# Altium footprint library L3.PcbLib: 47 footprints (part 2 of 3)
Each footprint in its own frame and in the unit in brackets; x right, y up, seen from the top. Pads: shape width x height; smd on the part's side, far side on the other; paste and mask are expansions set on the pad; w line width, h text height; cw(c..) or ccw(c..) is an arc to the next point about the centre after c.
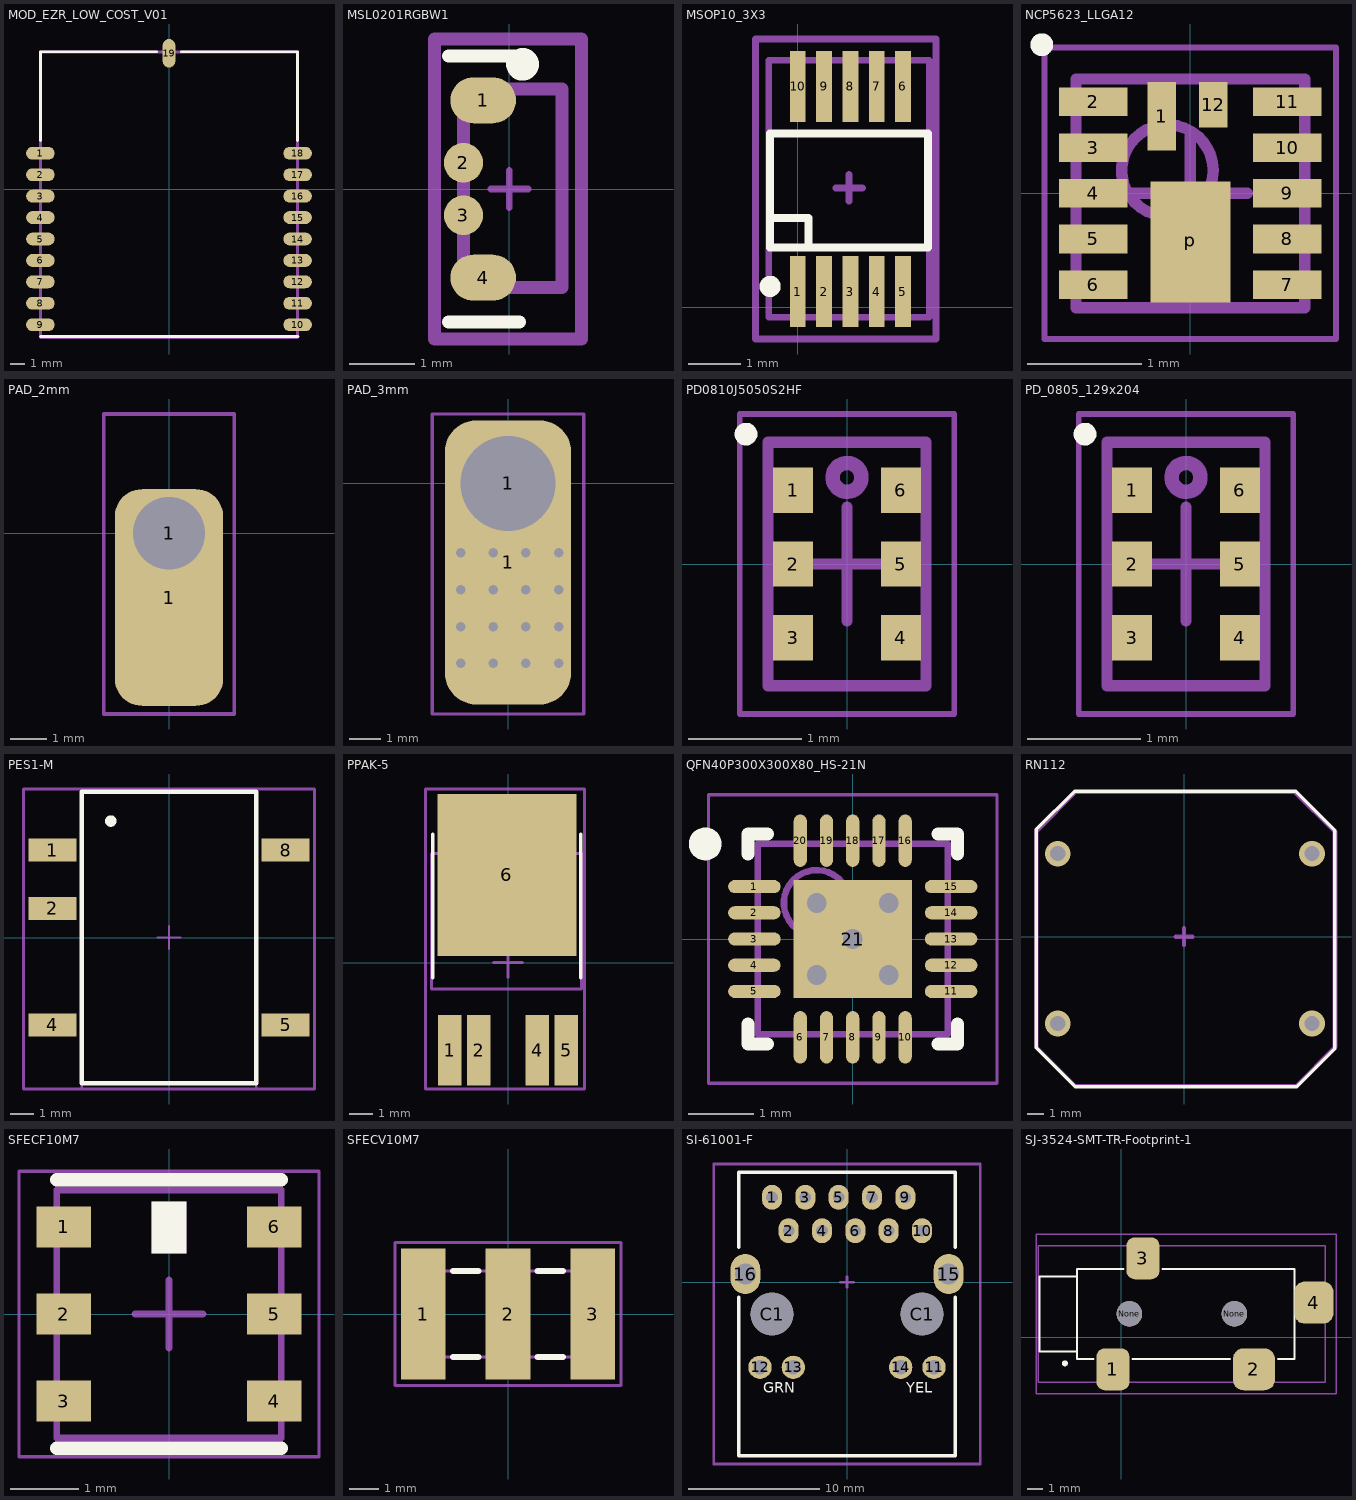
[diagram p1: the footprints below, top view; thin cyan lines are the x and y axes]

## MOD_EZR_LOW_COST_V01 [mm]
pads (19):
  oval 2x0.9 smd: 1(-9,2.5) 2(-9,1) 3(-9,-0.5) 4(-9,-2) 5(-9,-3.5) 6(-9,-5) 7(-9,-6.5) 8(-9,-8) 9(-9,-9.5) 10(9,-9.5) 11(9,-8) 12(9,-6.5) 13(9,-5) 14(9,-3.5) 15(9,-2) 16(9,-0.5) 17(9,1) 18(9,2.5)
  oval 0.9x2 smd: 19(0,9.5)
Top Overlay:
  lines w0.2: -9,-10.327 9.034,-10.327 ; -9,3.389 -9,9.612 -0.872,9.612 ; 0.872,9.612 9,9.612 9,3.389
Mechanical 1:
  lines w0.2: -9,-10.4 9,-10.4 9,9.6 -9,9.6 -9,-10.4
Mechanical 17:
  text "'.Designator'" at -6.096,-0.127 h1.52
3D body "Low_cost_module_PCB.step": height 2.96, standoff 0, extent -9,-10.4 9,9.6

## MSL0201RGBW1 [mm]
pads (4):
  oval 1x0.7 smd paste+0 mask+0: 1(-0.4,1.35) 4(-0.4,-1.35)
  round 0.6 smd paste+0 mask+0: 2(-0.7,0.4) 3(-0.7,-0.4)
Top Overlay:
  circle w0.25: c0.2,1.9 r0.125
  lines w0.2: -0.925,-2.025 0.15,-2.025 ; -0.925,2.025 0.15,2.025
Mechanical 2:
  lines w0.2: -0.7,-1.5 0.8,-1.5 0.801,1.524 -0.7,1.524 -0.7,-1.5
Mechanical 4:
  lines w0.1: -0.285,0 0.285,0 ; 0,-0.285 0,0.285
  lines w0.2: -1.143,-2.286 1.1,-2.286 1.1,2.286 -1.143,2.286 -1.143,-2.286
3D body "3dmodel.step": height 0.95, standoff -0.05, extent -0.703,-1.5 0.8,1.5

## MSOP10_3X3 [mm]
pads (10):
  rect 0.3x1.35 smd: 1(0,0.3) 2(0.5,0.3) 3(1,0.3) 4(1.5,0.3) 5(2,0.3) 6(2,4.2) 7(1.5,4.2) 8(1,4.2) 9(0.5,4.2) 10(0,4.2)
Top Overlay:
  circle w0.2: c-0.525,0.4 r0.1
  lines w0.152: -0.525,1.7 0.2,1.7 0.2,1.143 ; -0.525,1.143 2.475,1.143 2.475,3.302 -0.525,3.302 -0.525,1.143
Mechanical 1:
  lines w0.127: 0.721,2.27 1.229,2.27 ; 0.975,2.016 0.975,2.524 ; -0.803,-0.6 -0.803,5.1 2.626,5.1 2.626,-0.6 -0.803,-0.6
Mechanical 5:
  lines w0.127: -0.549,-0.185 -0.549,4.699 2.499,4.699 2.499,-0.185 -0.549,-0.185
3D body "User Library-msop-10.step": height 1.14, standoff -0.01, extent -0.499,-0.185 2.501,4.715

## NCP5623_LLGA12 [mm]
height 0.6
pads (13):
  rect 0.25x0.6 smd: 1(-0.25,0.675)
  rect 0.6x0.25 smd: 2(-0.85,0.8) 3(-0.85,0.4) 4(-0.85,0) 5(-0.85,-0.4) 6(-0.85,-0.8) 7(0.85,-0.8) 8(0.85,-0.4) 9(0.85,0) 10(0.85,0.4) 11(0.85,0.8)
  rect 0.25x0.4 smd: 12(0.2,0.775)
  rect 0.7x1.06 smd: p(0,-0.425)
Top Overlay:
  circle w0.1: c-1.3,1.3 r0.05
Mechanical 13:
  circle w0.1: c-0.2,0.2 r0.4
  lines w0.1: -1,-1 1,-1 1,1 -1,1 -1,-1
Mechanical 15:
  lines w0.05: -1.275,-1.275 1.275,-1.275 1.275,1.275 -1.275,1.275 -1.275,-1.275
  lines w0.1: -0.5,0 0.5,0 ; 0,-0.5 0,0.5
3D body "User Library-NCP5623C.step": height 0.45, standoff -0.05, extent -1,-1 1,1

## PAD_2mm [mm]
pads (2):
  rrect50% 3x6 smd: 1(0,-1.778)
  rrect50% 1.4x1.4 hole 2: 1(0,0)
Mechanical 1:
  lines w0.1: -1.8,-5 1.8,-5 1.8,3.3 -1.8,3.3 -1.8,-5

## PAD_3mm [mm]
pads (2):
  rrect50% 4x9 smd: 1(0,-2.5)
  rrect50% 3.5x3.5 hole 3: 1(0,0)
via 0.567,-2.2 diameter 0.6 hole 0.3
via 0.567,-3.367 diameter 0.6 hole 0.3
via 0.567,-4.533 diameter 0.6 hole 0.3
via 0.567,-5.7 diameter 0.6 hole 0.3
via -0.467,-2.2 diameter 0.6 hole 0.3
via -0.467,-3.367 diameter 0.6 hole 0.3
via -0.467,-4.533 diameter 0.6 hole 0.3
via -0.467,-5.7 diameter 0.6 hole 0.3
via -1.5,-2.2 diameter 0.6 hole 0.3
via 1.6,-2.2 diameter 0.6 hole 0.3
via 1.6,-3.367 diameter 0.6 hole 0.3
via -1.5,-3.367 diameter 0.6 hole 0.3
via 1.6,-4.533 diameter 0.6 hole 0.3
via -1.5,-4.533 diameter 0.6 hole 0.3
via 1.6,-5.7 diameter 0.6 hole 0.3
via -1.5,-5.7 diameter 0.6 hole 0.3
Mechanical 1:
  lines w0.1: -2.4,-7.3 2.4,-7.3 2.4,2.2 -2.4,2.2 -2.4,-7.3

## PD0810J5050S2HF [mm] "6-Leads, Body 1,29x2,04mm, Pitch 0,65mm, IPC Medium Density"
height 0.55
pads (6):
  rect 0.35x0.4 smd: 1(-0.475,0.65) 2(-0.475,0) 3(-0.475,-0.65) 4(0.475,-0.65) 5(0.475,0) 6(0.475,0.65)
Top Overlay:
  circle w0.1: c-0.889,1.143 r0.05
Mechanical 13:
  circle w0.127: c0,0.762 r0.127
  lines w0.1: -0.695,-1.07 0.695,-1.07 0.695,1.07 -0.695,1.07 -0.695,-1.07
Mechanical 15:
  lines w0.05: -0.945,-1.32 0.945,-1.32 0.945,1.32 -0.945,1.32 -0.945,-1.32
  lines w0.1: -0.5,0 0.5,0 ; 0,-0.5 0,0.5
Mechanical 17:
  text "'.Designator'" at -0.127,0.508 h0.38
Mechanical 19:
  text "'.Comment'" at -0.127,0.508 h0.38
3D body "User Library-B0322J5050AHF.step": height 0.7, standoff -0.01, extent -0.645,-1.02 0.645,1.02

## PD_0805_129x204 [mm] "6-Leads, Body 1,29x2,04mm, Pitch 0,65mm, IPC Medium Density"
height 0.55
pads (6):
  rect 0.35x0.4 smd: 1(-0.475,0.65) 2(-0.475,0) 3(-0.475,-0.65) 4(0.475,-0.65) 5(0.475,0) 6(0.475,0.65)
Top Overlay:
  circle w0.1: c-0.889,1.143 r0.05
Mechanical 13:
  circle w0.127: c0,0.762 r0.127
  lines w0.1: -0.695,-1.07 0.695,-1.07 0.695,1.07 -0.695,1.07 -0.695,-1.07
Mechanical 15:
  lines w0.05: -0.945,-1.32 0.945,-1.32 0.945,1.32 -0.945,1.32 -0.945,-1.32
  lines w0.1: -0.5,0 0.5,0 ; 0,-0.5 0,0.5
Mechanical 17:
  text "'.Designator'" at -0.127,0.508 h0.38
Mechanical 19:
  text "'.Comment'" at -0.127,0.508 h0.38
3D body "User Library-B0322J5050AHF.step": height 0.7, standoff -0.01, extent -0.645,-1.02 0.645,1.02

## PES1-M [mm]
pads (5):
  rect 2.1x1 smd: 1(-5.08,3.81) 2(-5.08,1.27) 4(-5.08,-3.81) 5(5.08,-3.81) 8(5.08,3.81)
Top Overlay:
  circle w0.25: c-2.54,5.08 r0.125
  lines w0.2: -3.81,-6.35 -3.81,6.35 3.81,6.35 3.81,-6.35 -3.81,-6.35
Mechanical 13:
  lines w0.1: -3.81,-6.604 -3.81,6.477 3.81,6.477 3.81,-6.604 -3.81,-6.604
Mechanical 15:
  lines w0.1: -0.5,0 0.5,0 ; 0,-0.5 0,0.5
  lines w0.127: -6.35,-6.604 6.35,-6.604 6.35,6.477 -6.35,6.477 -6.35,-6.604
Mechanical 17:
  text "'.Designator'" at -3.81,0 h0.64
Mechanical 19:
  text "'.Comment'" at -2.54,0 h0.64
3D body "CUI_PES1-S5-S9-M.step": height 7.25, standoff 0, extent -5.622,-6.35 5.622,6.35

## PPAK-5 [mil]
pads (5):
  rect 40x120 smd: 1(-99,-149.02) 2(-49.5,-149.02) 4(49.5,-149.02) 5(99,-149.02)
  rect 236.22x275.59 smd: 6(-2.02,149.02)
Top Overlay:
  lines w6: -128,-25.98 -128,218.12 ; 123.97,-25.98 123.97,218.12
Mechanical 13:
  lines w5: -130,-45 -130,185 125,185 125,-45 -130,-45
Mechanical 15:
  lines w5: -25,0 25,0 ; 0,-25 0,25 ; -140,-215 -140,295 -135,295 130,295 130,-215 -140,-215
Mechanical 17:
  text "'.Designator'" at -140,-15 h25
3D body "User Library-PPAK.step": height 90.55, standoff 0, extent -124.97,-168.97 127,212.92

## QFN40P300X300X80_HS-21N [mm] "QFN, 20-Leads, Body 3,00x3,00mm, Pitch 0,40mm, Thermal Pad 1,80x1,80mm, IPC Medium Density"
height 0.8
pads (21):
  oval 0.8x0.2 smd mask+0.05: 1(-1.5,0.8) 2(-1.5,0.4) 3(-1.5,0) 4(-1.5,-0.4) 5(-1.5,-0.8) 11(1.5,-0.8) 12(1.5,-0.4) 13(1.5,0) 14(1.5,0.4) 15(1.5,0.8)
  oval 0.2x0.8 smd mask+0.05: 6(-0.8,-1.5) 7(-0.4,-1.5) 8(0,-1.5) 9(0.4,-1.5) 10(0.8,-1.5) 16(0.8,1.5) 17(0.4,1.5) 18(0,1.5) 19(-0.4,1.5) 20(-0.8,1.5)
  rect 1.8x1.8 smd paste-3 mask+0.05: 21(0,0)
via -0.55,0.55 diameter 0.6 hole 0.3
via 0.55,0.55 diameter 0.6 hole 0.3
via -0.55,-0.55 diameter 0.6 hole 0.3
via 0.55,-0.55 diameter 0.6 hole 0.3
via 0,0 diameter 0.6 hole 0.3
Top Overlay:
  circle w0.25: c-2.25,1.45 r0.125
  lines w0.2: -1.6,-1.3 -1.6,-1.6 -1.3,-1.6 ; -1.6,1.3 -1.6,1.6 -1.3,1.6 ; 1.3,-1.6 1.6,-1.6 1.6,-1.3 ; 1.3,1.6 1.6,1.6 1.6,1.3
Top Paste:
  region: 0.15,-0.15 0.88,-0.15 0.88,-0.88 0.15,-0.88
  region: -0.88,-0.15 -0.15,-0.15 -0.15,-0.88 -0.88,-0.88
  region: -0.88,0.88 -0.15,0.88 -0.15,0.15 -0.88,0.15
  region: 0.15,0.88 0.88,0.88 0.88,0.15 0.15,0.15
Mechanical 13:
  circle w0.1: c-0.55,0.55 r0.5
  lines w0.1: -1.45,-1.45 -1.45,1.45 1.45,1.45 1.45,-1.45 -1.45,-1.45
Mechanical 15:
  lines w0.05: -2.2,-2.2 -2.2,2.2 2.2,2.2 2.2,-2.2 -2.2,-2.2
  lines w0.1: -0.5,0 0.5,0 ; 0,-0.5 0,0.5
3D body "QFN40P300X300X80_HS-21N.step": height 0.8, standoff 0, extent -1.5,-1.5 1.5,1.5

## RN112 [mm]
via 7.595,4.928 diameter 1.524 hole 0.9
via 7.595,-5.156 diameter 1.524 hole 0.9
via -7.493,-5.156 diameter 1.524 hole 0.9
via -7.493,4.928 diameter 1.524 hole 0.9
Top Overlay:
  lines w0.2: -8.763,6.325 -8.763,5.41 -8.763,-4.699 -8.763,-6.121 -8.763,-6.452 -8.763,-6.604 -6.452,-8.915 6.299,-8.915 6.68,-8.915 8.941,-6.655 8.941,-6.629 ; -8.763,6.35 -8.763,6.375 -6.502,8.636 -6.121,8.636 6.629,8.636 8.941,6.325 8.941,6.172 8.941,5.842 8.941,4.42 8.941,-5.69 8.941,-6.604
Mechanical 13:
  lines w0.2: -8.738,-6.553 -8.738,6.325 -6.477,8.585 6.553,8.585 8.915,6.223 8.915,-6.579 6.655,-8.839 -6.452,-8.839 -8.738,-6.553
Mechanical 15:
  lines w0.2: -8.788,6.299 -8.788,-6.528 -6.426,-8.89 6.629,-8.89 9.017,-6.502 9.017,6.198 6.655,8.56 -6.426,8.56 -8.687,6.299
  lines w0.254: -0.5,0 0.5,0 ; 0,-0.5 0,0.5
  text "1" at -6.096,-6.604 h1.52
  text "3" at -6.096,4.064 h1.52
  text "4" at 5.588,4.064 h1.52
  text "2" at 5.588,-6.096 h1.52
Mechanical 17:
  text "'.Designator'" at -3.556,0.508 h0.76
Mechanical 19:
  text "'.Comment'" at -3.048,-1.016 h0.76
3D body "36012.stp": height 12.5, standoff -4.1, extent -8.759,-8.865 8.941,8.636

## SFECF10M7 [mm] "6-Leads, Body 3,45x3,10mm, Pitch 1,28mm, IPC Medium Density"
height 1.4
pads (6):
  rect 0.8x0.6 smd: 1(-1.545,1.28) 2(-1.545,0) 3(-1.545,-1.28) 4(1.545,-1.28) 5(1.545,0) 6(1.545,1.28)
Top Overlay:
  rectangle: -0.254,0.889 0.254,1.651
  lines w0.2: -1.65,-1.975 1.65,-1.975 ; -1.65,1.975 1.65,1.975
Mechanical 13:
  rectangle: -0.254,0.889 0.254,1.651
  lines w0.1: -1.65,-1.825 1.65,-1.825 1.65,1.825 -1.65,1.825 -1.65,-1.825
Mechanical 15:
  lines w0.05: -2.205,-2.1 2.205,-2.1 2.205,2.1 -2.205,2.1 -2.205,-2.1
  lines w0.1: -0.5,0 0.5,0 ; 0,-0.5 0,0.5
Mechanical 17:
  text "'.Designator'" at -0.127,0.889 h0.38
Mechanical 19:
  text "'.Comment'" at -0.127,0.889 h0.38
3D body "User Library-SFECF10M7EA00S0-R0.step": height 1.32, standoff 0, extent -1.57,-1.725 1.57,1.725

## SFECV10M7 [mm]
pads (3):
  rect 1.5x4.4 smd: 1(-2.85,0) 2(0,0) 3(2.85,0)
Top Overlay:
  lines w0.2: -1.854,-1.448 -0.991,-1.448 ; -1.854,1.448 -0.991,1.448 ; 0.991,-1.45 1.854,-1.45 ; 0.991,1.448 1.854,1.448
Mechanical 13:
  lines w0.1: -3.429,-1.45 3.429,-1.45 3.429,1.45 -3.429,1.45 -3.429,-1.45
Mechanical 15:
  lines w0.1: -0.5,0 0.5,0 ; 0,-0.5 0,0.5 ; -3.81,-2.413 3.81,-2.413 3.81,2.413 -3.81,2.413 -3.81,-2.413
Mechanical 17:
  text "'.Designator'" at -3.048,-0.127 h0.61
Mechanical 19:
  text "'.Comment'" at -3.048,-0.127 h0.61
3D body "User Library-SFECV.STEP": height 1.53, standoff 0.01, extent -3.5,-1.524 3.5,1.496

## SI-61001-F [mm]
pads (18):
  oval 1.525x1.9 hole 0.9: 1(-5.715,6.477) 2(-4.445,3.937) 3(-3.175,6.477) 4(-1.905,3.937) 5(-0.635,6.477) 6(0.635,3.937) 7(1.905,6.477) 8(3.175,3.937) 9(4.445,6.477) 10(5.715,3.937)
  round 1.778 hole 1.1: 11(6.629,-6.477) 12(-6.629,-6.477) 13(-4.089,-6.477) 14(4.089,-6.477)
  oval 2.286x3.048 hole 1.6: 15(7.747,0.635) 16(-7.747,0.635)
  round 3.251 hole 3.25 unplated: C1(-5.715,-2.413) C1(5.715,-2.413)
Top Overlay:
  lines w0.254: -8.255,-1.143 -8.255,-13.208 8.255,-13.208 8.255,-1.143 ; -8.255,2.667 -8.255,8.382 8.255,8.382 8.255,2.667
  text "GRN" at -6.401,-8.407 h0.8
  text "YEL" at 4.521,-8.407 h0.8
Mechanical 13:
  lines w0.2: -10.16,-13.843 10.16,-13.843 10.16,9.017 -10.16,9.017 -10.16,-13.843
Mechanical 15:
  lines w0.2: -0.5,0.021 0.5,0.021 ; 0,-0.379 0,0.421 ; -10.16,-13.843 -10.16,9.017 10.16,9.017 10.16,-13.843 -10.16,-13.843
Mechanical 17:
  text "'.Designator'" at -5.334,-9.754 h1.02
Mechanical 19:
  text "'.Comment'" at -4.267,0.051 h1.02
3D body "User Library-JD0-0001NL.STEP": height 15.44, standoff -3.44, extent -9.605,-13.12 9.655,8.23

## SJ-3524-SMT-TR-Footprint-1 [mm]
pads (6):
  rrect50% 2.2x2.8 smd: 1(-0.571,-2.125) 3(1.429,5.275)
  rrect50% 2.8x2.8 smd: 2(8.829,-2.125)
  rrect50% 2.6x2.8 smd: 4(12.829,2.325)
  round 1.7 hole 1.7 unplated: None(0.529,1.575) None(7.529,1.575)
Top Overlay:
  circle w0.2: c-3.771,-1.725 r0.1
  lines w0.127: -1.871,-1.425 -2.971,-1.425 -2.971,-0.925 ; 0.129,4.575 -2.971,4.575 -2.971,4.075 ; 0.729,-1.425 7.229,-1.425 ; 2.729,4.575 11.529,4.575 11.529,-1.425 10.429,-1.425 ; -2.971,-0.925 -5.471,-0.925 -5.471,4.075 -2.971,4.075 ; -2.971,-0.925 -2.971,4.075
Mechanical 2:
  lines w0.1: -5.55,-2.975 -5.55,6.1 13.55,6.1 13.575,6.075 13.575,-2.975 13.55,-3 -5.525,-3 -5.55,-2.975
Mechanical 4:
  lines w0.1: -5.7,-3.75 -5.7,6.875 14.3,6.875 14.3,-3.75 -5.7,-3.75
3D body "CUI_SJ-3524-SMT-TR.step": height 5, standoff -0.8, extent -5.475,-2.9 13.525,6.1